# Altium footprint library Connector.PcbLib: 536 footprints (part 27 of 34)
Each footprint in its own frame and in the unit in brackets; x right, y up, seen from the top. Pads: shape width x height; smd on the part's side, far side on the other; paste and mask are expansions set on the pad; w line width, h text height; cw(c..) or ccw(c..) is an arc to the next point about the centre after c.
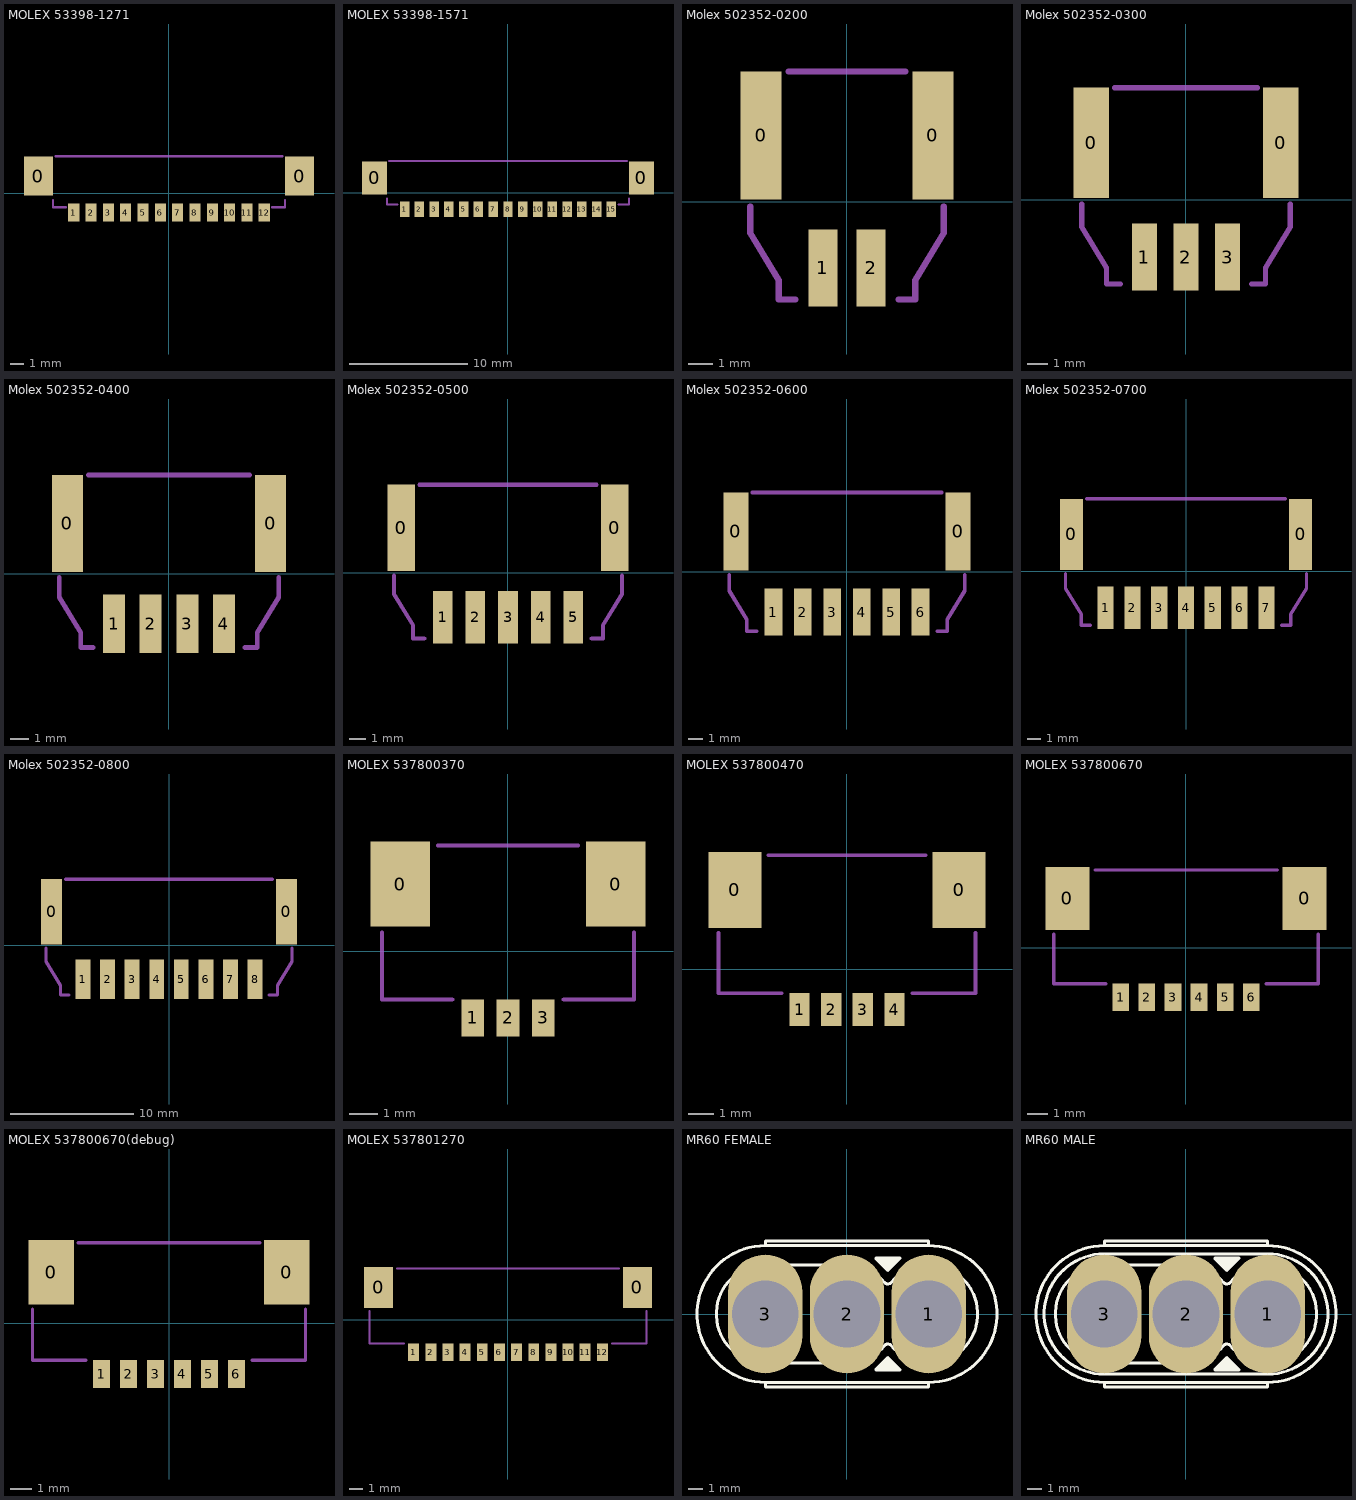
[diagram p26: the footprints below, top view; thin cyan lines are the x and y axes]

## MOLEX 53398-1271 [mm]
pads (14):
  rect 2.1x2.8 smd: 0(-9.425,1.248) 0(9.425,1.248)
  rect 0.8x1.3 smd: 1(-6.875,-1.4) 2(-5.625,-1.4) 3(-4.375,-1.4) 4(-3.125,-1.4) 5(-1.875,-1.4) 6(-0.625,-1.4) 7(0.625,-1.4) 8(1.875,-1.4) 9(3.125,-1.4) 10(4.375,-1.4) 11(5.625,-1.4) 12(6.875,-1.4)
Mechanical 15:
  lines w0.15: -8.374,-0.486 -8.374,-1.004 -7.45,-1.004 ; -8.2,2.674 8.2,2.674 ; 7.45,-1.004 8.374,-1.004 8.374,-0.486
3D body "533981271.stp": height 4.69, standoff -0.01, extent -10.075,-1.562 10.075,2.638

## MOLEX 53398-1571 [mm]
pads (17):
  rect 2.1x2.8 smd: 0(-11.3,1.248) 0(11.3,1.248)
  rect 0.8x1.3 smd: 1(-8.75,-1.4) 2(-7.5,-1.4) 3(-6.25,-1.4) 4(-5,-1.4) 5(-3.75,-1.4) 6(-2.5,-1.4) 7(-1.25,-1.4) 8(0,-1.4) 9(1.25,-1.4) 10(2.5,-1.4) 11(3.75,-1.4) 12(5,-1.4) 13(6.25,-1.4) 14(7.5,-1.4) 15(8.75,-1.4)
Mechanical 15:
  lines w0.15: -10.249,-0.486 -10.249,-1.004 -9.325,-1.004 ; -10.075,2.674 10.075,2.674 ; 9.325,-1.004 10.249,-1.004 10.249,-0.486

## Molex 502352-0200 [mm]
pads (4):
  rect 1.7x5.3 smd: 0(-3.55,2.74) 0(3.55,2.74)
  rect 1.2x3.2 smd: 1(-1,-2.74) 2(1,-2.74)
Mechanical 15:
  lines w0.254: -4,-0.2 -4,-1.292 -2.82,-3.248 -2.82,-4.034 ; -2.82,-4.04 -2.14,-4.04 ; -2.42,5.388 2.42,5.388 ; 2.14,-4.04 2.82,-4.04 ; 2.82,-4.034 2.82,-3.248 4,-1.292 4,-0.2
3D body "5023520200.stp": height 6.36, standoff -0.04, extent -4,-4.012 4,5.388

## Molex 502352-0300 [mm]
pads (5):
  rect 1.7x5.3 smd: 0(-4.55,2.74) 0(4.55,2.74)
  rect 1.2x3.2 smd: 1(-2,-2.74) 2(0,-2.74) 3(2,-2.74)
Mechanical 15:
  lines w0.254: -5,-0.2 -5,-1.292 -3.82,-3.248 -3.82,-4.034 ; -3.82,-4.04 -3.14,-4.04 ; -3.42,5.388 3.42,5.388 ; 3.14,-4.04 3.82,-4.04 ; 3.82,-4.034 3.82,-3.248 5,-1.292 5,-0.2
3D body "5023520300.stp": height 6.36, standoff -0.04, extent -5,-4.012 5,5.388

## Molex 502352-0400 [mm]
pads (6):
  rect 1.7x5.3 smd: 0(-5.55,2.74) 0(5.55,2.74)
  rect 1.2x3.2 smd: 1(-3,-2.74) 2(-1,-2.74) 3(1,-2.74) 4(3,-2.74)
Mechanical 15:
  lines w0.254: -6,-0.2 -6,-1.292 -4.82,-3.248 -4.82,-4.034 ; -4.82,-4.04 -4.14,-4.04 ; -4.42,5.388 4.42,5.388 ; 4.14,-4.04 4.82,-4.04 ; 4.82,-4.034 4.82,-3.248 6,-1.292 6,-0.2
3D body "5023520400.stp": height 6.36, standoff -0.04, extent -6,-4.012 6,5.388

## Molex 502352-0500 [mm]
pads (7):
  rect 1.7x5.3 smd: 0(-6.55,2.74) 0(6.55,2.74)
  rect 1.2x3.2 smd: 1(-4,-2.74) 2(-2,-2.74) 3(0,-2.74) 4(2,-2.74) 5(4,-2.74)
Mechanical 15:
  lines w0.254: -7,-0.2 -7,-1.292 -5.82,-3.248 -5.82,-4.034 ; -5.82,-4.04 -5.14,-4.04 ; -5.42,5.388 5.42,5.388 ; 5.14,-4.04 5.82,-4.04 ; 5.82,-4.034 5.82,-3.248 7,-1.292 7,-0.2
3D body "5023520500.stp": height 6.36, standoff -0.04, extent -7,-4.015 7,5.385

## Molex 502352-0600 [mm]
pads (8):
  rect 1.7x5.3 smd: 0(-7.55,2.74) 0(7.55,2.74)
  rect 1.2x3.2 smd: 1(-5,-2.74) 2(-3,-2.74) 3(-1,-2.74) 4(1,-2.74) 5(3,-2.74) 6(5,-2.74)
Mechanical 15:
  lines w0.254: -8,-0.2 -8,-1.292 -6.82,-3.248 -6.82,-4.034 ; -6.82,-4.04 -6.14,-4.04 ; -6.42,5.388 6.42,5.388 ; 6.14,-4.04 6.82,-4.04 ; 6.82,-4.034 6.82,-3.248 8,-1.292 8,-0.2
3D body "5023520600.stp": height 6.36, standoff -0.04, extent -8,-4.015 8,5.385

## Molex 502352-0700 [mm]
pads (9):
  rect 1.7x5.3 smd: 0(-8.55,2.74) 0(8.55,2.74)
  rect 1.2x3.2 smd: 1(-6,-2.74) 2(-4,-2.74) 3(-2,-2.74) 4(0,-2.74) 5(2,-2.74) 6(4,-2.74) 7(6,-2.74)
Mechanical 15:
  lines w0.254: -9,-0.2 -9,-1.292 -7.82,-3.248 -7.82,-4.034 ; -7.82,-4.04 -7.14,-4.04 ; -7.42,5.388 7.42,5.388 ; 7.14,-4.04 7.82,-4.04 ; 7.82,-4.034 7.82,-3.248 9,-1.292 9,-0.2
3D body "5023520700.stp": height 6.36, standoff -0.04, extent -9,-4.015 9,5.385

## Molex 502352-0800 [mm]
pads (10):
  rect 1.7x5.3 smd: 0(-9.55,2.74) 0(9.55,2.74)
  rect 1.2x3.2 smd: 1(-7,-2.74) 2(-5,-2.74) 3(-3,-2.74) 4(-1,-2.74) 5(1,-2.74) 6(3,-2.74) 7(5,-2.74) 8(7,-2.74)
Mechanical 15:
  lines w0.254: -10,-0.2 -10,-1.292 -8.82,-3.248 -8.82,-4.034 ; -8.82,-4.04 -8.14,-4.04 ; -8.42,5.388 8.42,5.388 ; 8.14,-4.04 8.82,-4.04 ; 8.82,-4.034 8.82,-3.248 10,-1.292 10,-0.2
3D body "5023520800.stp": height 6.36, standoff -0.04, extent -10,-4.015 10,5.385

## MOLEX 537800370 [mm]
height 1.35
pads (5):
  rect 2.1x3 smd: 0(-3.8,2.365) 0(3.8,2.365)
  rect 0.8x1.3 smd: 1(-1.25,-2.365) 2(0,-2.365) 3(1.25,-2.365)
Mechanical 15:
  lines w0.15: -4.45,0.657 -4.45,-1.715 -1.966,-1.715 ; -2.474,3.731 2.474,3.731 ; 1.966,-1.715 4.45,-1.715 4.45,0.657
3D body "537800370.stp": height 1.89, standoff -0.01, extent -4.45,-2.694 4.45,3.806

## MOLEX 537800470 [mm]
height 1.35
pads (6):
  rect 2.1x3 smd: 0(-4.425,3.13) 0(4.425,3.13)
  rect 0.8x1.3 smd: 1(-1.875,-1.6) 2(-0.625,-1.6) 3(0.625,-1.6) 4(1.875,-1.6)
Mechanical 15:
  lines w0.15: -5.075,1.422 -5.075,-0.95 -2.591,-0.95 ; -3.099,4.496 3.099,4.496 ; 2.591,-0.95 5.075,-0.95 5.075,1.422
3D body "537800470.stp": height 1.89, standoff -0.01, extent -5.075,-1.93 5.075,4.57

## MOLEX 537800670 [mm]
height 1.35
pads (8):
  rect 2.1x3 smd: 0(-5.675,2.365) 0(5.675,2.365)
  rect 0.8x1.3 smd: 1(-3.125,-2.365) 2(-1.875,-2.365) 3(-0.625,-2.365) 4(0.625,-2.365) 5(1.875,-2.365) 6(3.125,-2.365)
Mechanical 15:
  lines w0.15: -6.325,0.657 -6.325,-1.715 -3.841,-1.715 ; -4.349,3.731 4.363,3.731 ; 3.841,-1.715 6.325,-1.715 6.325,0.657
3D body "537800670.stp": height 1.89, standoff -0.01, extent -6.318,-2.696 6.332,3.804

## MOLEX 537800670(debug) [mm]
height 1.35
pads (8):
  rect 2.1x3 smd: 0(-5.45,2.362) 0(5.45,2.365)
  rect 0.8x1.3 smd: 1(-3.125,-2.365) 2(-1.875,-2.365) 3(-0.625,-2.365) 4(0.625,-2.365) 5(1.875,-2.365) 6(3.125,-2.365)
Mechanical 15:
  lines w0.15: -6.325,0.657 -6.325,-1.715 -3.841,-1.715 ; -4.2,3.731 4.2,3.731 ; 3.841,-1.715 6.325,-1.715 6.325,0.657
3D body "537800670.stp": height 1.89, standoff -0.01, extent -6.318,-2.696 6.332,3.804

## MOLEX 537801270 [mm]
height 1.35
pads (14):
  rect 2.1x3 smd: 0(-9.425,2.365) 0(9.425,2.365)
  rect 0.8x1.3 smd: 1(-6.875,-2.365) 2(-5.625,-2.365) 3(-4.375,-2.365) 4(-3.125,-2.365) 5(-1.875,-2.365) 6(-0.625,-2.365) 7(0.625,-2.365) 8(1.875,-2.365) 9(3.125,-2.365) 10(4.375,-2.365) 11(5.625,-2.365) 12(6.875,-2.365)
Mechanical 15:
  lines w0.15: -10.075,0.657 -10.075,-1.715 -7.591,-1.715 ; -8.099,3.731 8.099,3.731 ; 7.591,-1.715 10.075,-1.715 10.075,0.657
3D body "537801270.stp": height 1.89, standoff -0.01, extent -10.075,-2.694 10.075,3.806

## MR60 FEMALE [mm]
pads (3):
  oval 5x8 hole 4.5: 1(5.5,0) 2(0,0) 3(-5.5,0)
Top Overlay:
  lines w0.203: -0.001,3.296 cw(c-0.001,-0.004) 2.527,2.117 ; -0.001,3.298 -5.498,3.298 -5.5,3.3 ccw(c-5.5,0) -5.5,-3.3 0,-3.3 ccw(c0,0) 2.528,-2.121 ; 2.1,-3.596 2.258,-3.754 ; 2.1,3.596 2.258,3.754 ; 2.24,-3.518 2.476,-3.754 ; 2.24,3.518 2.476,3.754 ; 2.347,-3.35 2.748,-3.752 ; 2.347,3.35 2.748,3.752 ; 2.473,-3.23 2.997,-3.754 ; 2.473,3.23 2.997,3.754 ; 2.542,-2.105 cw(c2.75,-2.322) 2.966,-2.114 ; 2.542,2.105 ccw(c2.75,2.322) 2.966,2.114 ; 2.614,-3.091 3.277,-3.754 ; 2.614,3.091 3.277,3.754 ; 2.966,-2.114 ccw(c5.5,0) 2.992,2.145 ; -5.5,-4.6 cw(c-5.5,0) -5.5,4.6 ; -5.5,-4.6 5.5,-4.6 ; -5.5,-4.6 -5.5,-4.9 5.5,-4.9 5.5,-4.6 ; -5.5,4.6 5.5,4.6 ; -5.5,4.6 -5.5,4.9 5.5,4.9 5.5,4.6 ; 5.5,-4.6 ccw(c5.5,0) 5.5,4.6 ; 1.942,-3.754 2.75,-2.946 3.558,-3.754 1.942,-3.754 ; 1.942,3.754 3.558,3.754 2.75,2.946 1.942,3.754
3D body: height 4.4, standoff 1.6, extent -10.099,-4.6 -0.901,4.6
3D body: height 4.4, standoff 1.6, extent 0.901,-4.6 10.099,4.6
3D body: height 4.4, standoff 1.6, extent -5.5,-4.6 5.5,4.6
3D body: height 13.7, standoff 0, extent -8.75,-3.25 -2.25,3.25
3D body: height 13.7, standoff 0, extent 2.25,-3.25 8.75,3.25
3D body: height 13, standoff -4, extent -7.648,-2.15 -3.352,2.15
3D body: height 13, standoff -4, extent -2.148,-2.15 2.148,2.15
3D body: height 13.7, standoff 0, extent -5.5,-3.25 0,3.25
3D body: height 13, standoff -4, extent 3.352,-2.15 7.648,2.15
3D body: height 13.7, standoff 0, extent -3.25,-3.25 3.25,3.25

## MR60 MALE [mm]
pads (3):
  oval 5x8 hole 4.5: 1(5.5,0) 2(0,0) 3(-5.5,0)
Top Overlay:
  lines w0.203: -0.001,3.296 cw(c-0.001,-0.004) 2.527,2.117 ; -0.001,3.298 -5.498,3.298 -5.5,3.3 ccw(c-5.5,0) -5.5,-3.3 0,-3.3 ccw(c0,0) 2.528,-2.121 ; 2.1,-3.596 2.258,-3.754 ; 2.1,3.596 2.258,3.754 ; 2.24,-3.518 2.476,-3.754 ; 2.24,3.518 2.476,3.754 ; 2.347,-3.35 2.748,-3.752 ; 2.347,3.35 2.748,3.752 ; 2.473,-3.23 2.997,-3.754 ; 2.473,3.23 2.997,3.754 ; 2.542,-2.105 cw(c2.75,-2.322) 2.966,-2.114 ; 2.542,2.105 ccw(c2.75,2.322) 2.966,2.114 ; 2.614,-3.091 3.277,-3.754 ; 2.614,3.091 3.277,3.754 ; 2.966,-2.114 ccw(c5.5,0) 2.992,2.145 ; -5.5,-4.6 cw(c-5.5,0) -5.5,4.6 ; -5.5,-4.6 5.5,-4.6 ; -5.5,-4.6 -5.5,-4.9 5.5,-4.9 5.5,-4.6 ; -5.5,4.6 5.5,4.6 ; -5.5,4.6 -5.5,4.9 5.5,4.9 5.5,4.6 ; 5.5,-4.6 ccw(c5.5,0) 5.5,4.6 ; -5.5,-4.05 cw(c-5.5,0) -5.5,4.05 5.5,4.05 cw(c5.5,0) 5.5,-4.05 -5.5,-4.05 ; 1.942,-3.754 2.75,-2.946 3.558,-3.754 1.942,-3.754 ; 1.942,3.754 3.558,3.754 2.75,2.946 1.942,3.754
3D body: height 4.4, standoff 1.6, extent -10.099,-4.6 -0.901,4.6
3D body: height 4.4, standoff 1.6, extent 0.901,-4.6 10.099,4.6
3D body: height 4.4, standoff 1.6, extent -5.5,-4.6 5.5,4.6
3D body: height 13.7, standoff 0, extent -9.55,-4.05 -1.45,4.05
3D body: height 13.7, standoff 0, extent 1.45,-4.05 9.55,4.05
3D body: height 13, standoff -4, extent -7.648,-2.15 -3.352,2.15
3D body: height 13, standoff -4, extent -2.148,-2.15 2.148,2.15
3D body: height 13.7, standoff 0, extent -5.5,-4.064 5.5,4.054
3D body: height 13, standoff -4, extent 3.352,-2.15 7.648,2.15